# Altium footprint library SAMTEC THD.PcbLib: 161 footprints (part 4 of 12)
Each footprint in its own frame and in the unit in brackets; x right, y up, seen from the top. Pads: shape width x height; smd on the part's side, far side on the other; paste and mask are expansions set on the pad; w line width, h text height; cw(c..) or ccw(c..) is an arc to the next point about the centre after c.
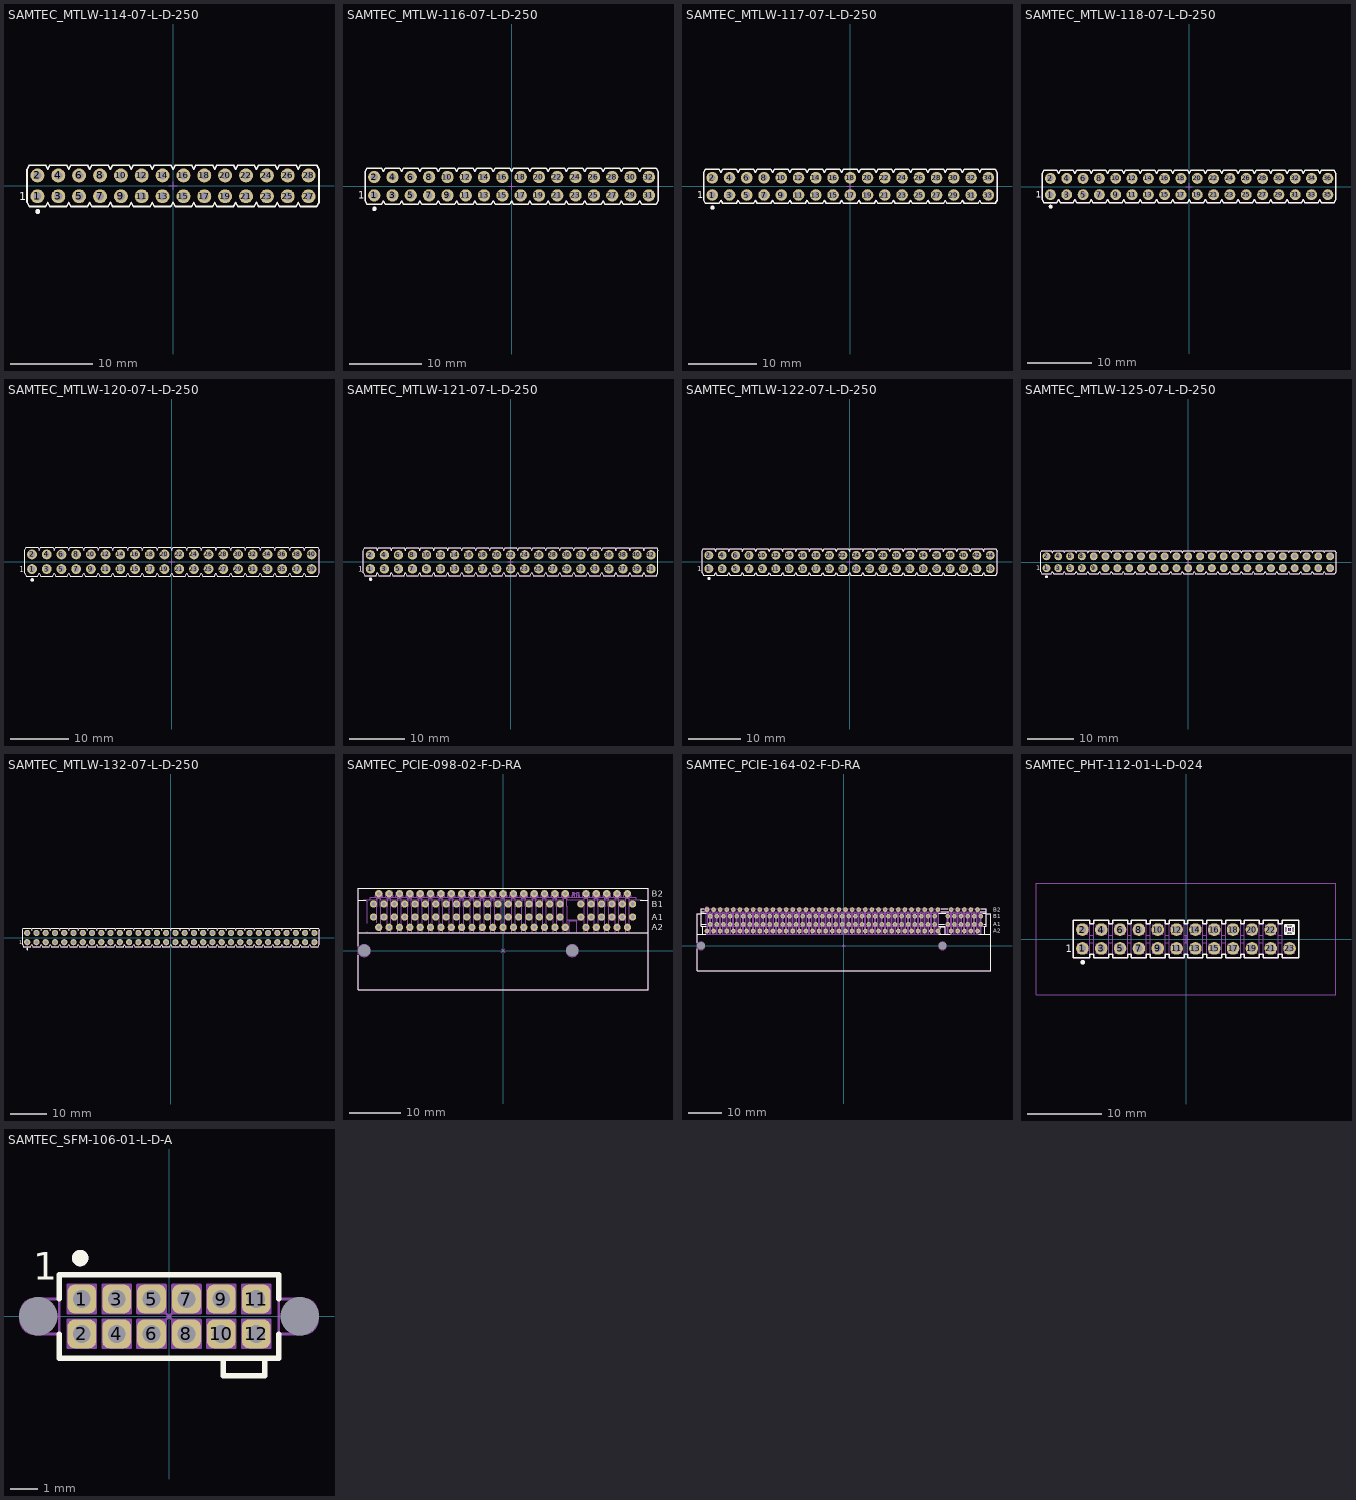
[diagram p3: the footprints below, top view; thin cyan lines are the x and y axes]

## SAMTEC_MTLW-114-07-L-D-250 [mm] "28 Contacts - Pitch 2.54mm - Dual Row Through Mount Straight Header (Post Lead = 6.35mm, Tail Lead 3.05mm, Insulator 1.52mm)"
height 7.87
pads (28):
  round 1.7 hole 1: 1(-16.51,-1.27) 2(-16.51,1.27) 3(-13.97,-1.27) 4(-13.97,1.27) 5(-11.43,-1.27) 6(-11.43,1.27) 7(-8.89,-1.27) 8(-8.89,1.27) 9(-6.35,-1.27) 10(-6.35,1.27) 11(-3.81,-1.27) 12(-3.81,1.27) 13(-1.27,-1.27) 14(-1.27,1.27) 15(1.27,-1.27) 16(1.27,1.27) 17(3.81,-1.27) 18(3.81,1.27) 19(6.35,-1.27) 20(6.35,1.27) 21(8.89,-1.27) 22(8.89,1.27) 23(11.43,-1.27) 24(11.43,1.27) 25(13.97,-1.27) 26(13.97,1.27) 27(16.51,-1.27) 28(16.51,1.27)
Top Overlay:
  circle w0.3: c-16.475,-3.135 r0.15
  lines w0.2: -17.78,-2.007 -17.526,-2.515 -15.494,-2.515 -15.24,-2.007 -14.986,-2.515 -12.954,-2.515 -12.7,-2.007 -12.446,-2.515 -10.414,-2.515 -10.16,-2.007 -9.906,-2.515 -7.874,-2.515 -7.62,-2.007 -7.366,-2.515 -5.334,-2.515 -5.08,-2.007 -4.826,-2.515 -2.794,-2.515 -2.54,-2.007 -2.286,-2.515 -0.254,-2.515 0,-2.007 0.254,-2.515 2.286,-2.515 2.54,-2.007 2.794,-2.515 4.826,-2.515 5.08,-2.007 5.334,-2.515 7.366,-2.515 7.62,-2.007 7.874,-2.515 9.906,-2.515 10.16,-2.007 10.414,-2.515 12.446,-2.515 12.7,-2.007 12.954,-2.515 14.986,-2.515 15.24,-2.007 15.494,-2.515 17.526,-2.515 17.78,-2.007 17.78,2.007 17.526,2.515 15.494,2.515 15.24,2.007 14.986,2.515 12.954,2.515 12.7,2.007 12.446,2.515 10.414,2.515 10.16,2.007 9.906,2.515 7.874,2.515 7.62,2.007 7.366,2.515 5.334,2.515 5.08,2.007 4.826,2.515 2.794,2.515 2.54,2.007 2.286,2.515 0.254,2.515 0,2.007 -0.254,2.515 -2.286,2.515 -2.54,2.007 -2.794,2.515 -4.826,2.515 -5.08,2.007 -5.334,2.515 -7.366,2.515 -7.62,2.007 -7.874,2.515 -9.906,2.515 -10.16,2.007 -10.414,2.515 -12.446,2.515 -12.7,2.007 -12.954,2.515 -14.986,2.515 -15.24,2.007 -15.494,2.515 -17.526,2.515 -17.78,2.007 -17.78,-2.007
  text "1" at -18.757,-1.768 h1
Mechanical 8:
  lines w0.1: -17.01,-1.27 -16.51,-1.27 ; -17.01,1.27 -16.51,1.27 ; -16.51,-1.77 -16.51,-1.27 ; -16.51,-0.77 -16.51,-1.27 ; -16.51,0.77 -16.51,1.27 ; -16.51,1.77 -16.51,1.27 ; -16.01,-1.27 -16.51,-1.27 ; -16.01,1.27 -16.51,1.27 ; -14.47,-1.27 -13.97,-1.27 ; -14.47,1.27 -13.97,1.27 ; -13.97,-1.77 -13.97,-1.27 ; -13.97,-0.77 -13.97,-1.27 ; -13.97,0.77 -13.97,1.27 ; -13.97,1.77 -13.97,1.27 ; -13.47,-1.27 -13.97,-1.27 ; -13.47,1.27 -13.97,1.27 ; -11.93,-1.27 -11.43,-1.27 ; -11.93,1.27 -11.43,1.27 ; -11.43,-1.77 -11.43,-1.27 ; -11.43,-0.77 -11.43,-1.27 ; -11.43,0.77 -11.43,1.27 ; -11.43,1.77 -11.43,1.27 ; -10.93,-1.27 -11.43,-1.27 ; -10.93,1.27 -11.43,1.27 ; -9.39,-1.27 -8.89,-1.27 ; -9.39,1.27 -8.89,1.27 ; -8.89,-1.77 -8.89,-1.27 ; -8.89,-0.77 -8.89,-1.27 ; -8.89,0.77 -8.89,1.27 ; -8.89,1.77 -8.89,1.27 ; -8.39,-1.27 -8.89,-1.27 ; -8.39,1.27 -8.89,1.27 ; -6.85,-1.27 -6.35,-1.27 ; -6.85,1.27 -6.35,1.27 ; -6.35,-1.77 -6.35,-1.27 ; -6.35,-0.77 -6.35,-1.27 ; -6.35,0.77 -6.35,1.27 ; -6.35,1.77 -6.35,1.27 ; -5.85,-1.27 -6.35,-1.27 ; -5.85,1.27 -6.35,1.27 ; -4.31,-1.27 -3.81,-1.27 ; -4.31,1.27 -3.81,1.27 ; -3.81,-1.77 -3.81,-1.27 ; -3.81,-0.77 -3.81,-1.27 ; -3.81,0.77 -3.81,1.27 ; -3.81,1.77 -3.81,1.27 ; -3.31,-1.27 -3.81,-1.27 ; -3.31,1.27 -3.81,1.27 ; -1.77,-1.27 -1.27,-1.27 ; -1.77,1.27 -1.27,1.27 ; -1.27,-1.77 -1.27,-1.27 ; -1.27,-0.77 -1.27,-1.27 ; -1.27,0.77 -1.27,1.27 ; -1.27,1.77 -1.27,1.27 ; -0.77,-1.27 -1.27,-1.27 ; -0.77,1.27 -1.27,1.27 ; -0.5,0 0,0 ; 0,-0.5 0,0 ; 0,0.5 0,0 ; 0.5,0 0,0 ; 0.77,-1.27 1.27,-1.27 ; 0.77,1.27 1.27,1.27 ; 1.27,-1.77 1.27,-1.27 ; 1.27,-0.77 1.27,-1.27 ; 1.27,0.77 1.27,1.27 ; 1.27,1.77 1.27,1.27 ; 1.77,-1.27 1.27,-1.27 ; 1.77,1.27 1.27,1.27 ; 3.31,-1.27 3.81,-1.27 ; 3.31,1.27 3.81,1.27 ; 3.81,-1.77 3.81,-1.27 ; 3.81,-0.77 3.81,-1.27 ; 3.81,0.77 3.81,1.27 ; 3.81,1.77 3.81,1.27 ; 4.31,-1.27 3.81,-1.27 ; 4.31,1.27 3.81,1.27 ; 5.85,-1.27 6.35,-1.27 ; 5.85,1.27 6.35,1.27 ; 6.35,-1.77 6.35,-1.27 ; 6.35,-0.77 6.35,-1.27 ; 6.35,0.77 6.35,1.27 ; 6.35,1.77 6.35,1.27 ; 6.85,-1.27 6.35,-1.27 ; 6.85,1.27 6.35,1.27 ; 8.39,-1.27 8.89,-1.27 ; 8.39,1.27 8.89,1.27 ; 8.89,-1.77 8.89,-1.27 ; 8.89,-0.77 8.89,-1.27 ; 8.89,0.77 8.89,1.27 ; 8.89,1.77 8.89,1.27 ; 9.39,-1.27 8.89,-1.27 ; 9.39,1.27 8.89,1.27 ; 10.93,-1.27 11.43,-1.27 ; 10.93,1.27 11.43,1.27 ; 11.43,-1.77 11.43,-1.27 ; 11.43,-0.77 11.43,-1.27 ; 11.43,0.77 11.43,1.27 ; 11.43,1.77 11.43,1.27 ; 11.93,-1.27 11.43,-1.27 ; 11.93,1.27 11.43,1.27 ; 13.47,-1.27 13.97,-1.27 ; 13.47,1.27 13.97,1.27 ; 13.97,-1.77 13.97,-1.27 ; 13.97,-0.77 13.97,-1.27 ; 13.97,0.77 13.97,1.27 ; 13.97,1.77 13.97,1.27 ; 14.47,-1.27 13.97,-1.27 ; 14.47,1.27 13.97,1.27 ; 16.01,-1.27 16.51,-1.27 ; 16.01,1.27 16.51,1.27 ; 16.51,-1.77 16.51,-1.27 ; 16.51,-0.77 16.51,-1.27 ; 16.51,0.77 16.51,1.27 ; 16.51,1.77 16.51,1.27 ; 17.01,-1.27 16.51,-1.27 ; 17.01,1.27 16.51,1.27
Mechanical 14:
  drawing of 199 lines, arcs and shapes, not listed
  text "1" at -18.757,-1.768 h1
3D body "SAMTEC_MTLW-114-07-L-D-250.stp": height 7.87, standoff -3.05, extent -17.78,-2.514 17.78,2.515

## SAMTEC_MTLW-116-07-L-D-250 [mm] "32 Contacts - Pitch 2.54mm - Dual Row Through Mount Straight Header (Post Lead = 6.35mm, Tail Lead 3.05mm, Insulator 1.52mm)"
height 7.87
pads (32):
  round 1.7 hole 1: 1(-19.05,-1.27) 2(-19.05,1.27) 3(-16.51,-1.27) 4(-16.51,1.27) 5(-13.97,-1.27) 6(-13.97,1.27) 7(-11.43,-1.27) 8(-11.43,1.27) 9(-8.89,-1.27) 10(-8.89,1.27) 11(-6.35,-1.27) 12(-6.35,1.27) 13(-3.81,-1.27) 14(-3.81,1.27) 15(-1.27,-1.27) 16(-1.27,1.27) 17(1.27,-1.27) 18(1.27,1.27) 19(3.81,-1.27) 20(3.81,1.27) 21(6.35,-1.27) 22(6.35,1.27) 23(8.89,-1.27) 24(8.89,1.27) 25(11.43,-1.27) 26(11.43,1.27) 27(13.97,-1.27) 28(13.97,1.27) 29(16.51,-1.27) 30(16.51,1.27) 31(19.05,-1.27) 32(19.05,1.27)
Top Overlay:
  circle w0.3: c-19.015,-3.135 r0.15
  lines w0.2: -20.32,-2.007 -20.32,2.007 -20.066,2.515 -18.034,2.515 -17.78,2.007 -17.526,2.515 -15.494,2.515 -15.24,2.007 -14.986,2.515 -12.954,2.515 -12.7,2.007 -12.446,2.515 -10.414,2.515 -10.16,2.007 -9.906,2.515 -7.874,2.515 -7.62,2.007 -7.366,2.515 -5.334,2.515 -5.08,2.007 -4.826,2.515 -2.794,2.515 -2.54,2.007 -2.286,2.515 -0.254,2.515 0,2.007 0.254,2.515 2.286,2.515 2.54,2.007 2.794,2.515 4.826,2.515 5.08,2.007 5.334,2.515 7.366,2.515 7.62,2.007 7.874,2.515 9.906,2.515 10.16,2.007 10.414,2.515 12.446,2.515 12.7,2.007 12.954,2.515 14.986,2.515 15.24,2.007 15.494,2.515 17.526,2.515 17.78,2.007 18.034,2.515 20.066,2.515 20.32,2.007 20.32,-2.007 20.066,-2.515 18.034,-2.515 17.78,-2.007 17.526,-2.515 15.494,-2.515 15.24,-2.007 14.986,-2.515 12.954,-2.515 12.7,-2.007 12.446,-2.515 10.414,-2.515 10.16,-2.007 9.906,-2.515 7.874,-2.515 7.62,-2.007 7.366,-2.515 5.334,-2.515 5.08,-2.007 4.826,-2.515 2.794,-2.515 2.54,-2.007 2.286,-2.515 0.254,-2.515 0,-2.007 -0.254,-2.515 -2.286,-2.515 -2.54,-2.007 -2.794,-2.515 -4.826,-2.515 -5.08,-2.007 -5.334,-2.515 -7.366,-2.515 -7.62,-2.007 -7.874,-2.515 -9.906,-2.515 -10.16,-2.007 -10.414,-2.515 -12.446,-2.515 -12.7,-2.007 -12.954,-2.515 -14.986,-2.515 -15.24,-2.007 -15.494,-2.515 -17.526,-2.515 -17.78,-2.007 -18.034,-2.515 -20.066,-2.515 -20.32,-2.007
  text "1" at -21.297,-1.768 h1
Mechanical 8:
  lines w0.1: -19.55,-1.27 -19.05,-1.27 ; -19.55,1.27 -19.05,1.27 ; -19.05,-1.77 -19.05,-1.27 ; -19.05,-0.77 -19.05,-1.27 ; -19.05,0.77 -19.05,1.27 ; -19.05,1.77 -19.05,1.27 ; -18.55,-1.27 -19.05,-1.27 ; -18.55,1.27 -19.05,1.27 ; -17.01,-1.27 -16.51,-1.27 ; -17.01,1.27 -16.51,1.27 ; -16.51,-1.77 -16.51,-1.27 ; -16.51,-0.77 -16.51,-1.27 ; -16.51,0.77 -16.51,1.27 ; -16.51,1.77 -16.51,1.27 ; -16.01,-1.27 -16.51,-1.27 ; -16.01,1.27 -16.51,1.27 ; -14.47,-1.27 -13.97,-1.27 ; -14.47,1.27 -13.97,1.27 ; -13.97,-1.77 -13.97,-1.27 ; -13.97,-0.77 -13.97,-1.27 ; -13.97,0.77 -13.97,1.27 ; -13.97,1.77 -13.97,1.27 ; -13.47,-1.27 -13.97,-1.27 ; -13.47,1.27 -13.97,1.27 ; -11.93,-1.27 -11.43,-1.27 ; -11.93,1.27 -11.43,1.27 ; -11.43,-1.77 -11.43,-1.27 ; -11.43,-0.77 -11.43,-1.27 ; -11.43,0.77 -11.43,1.27 ; -11.43,1.77 -11.43,1.27 ; -10.93,-1.27 -11.43,-1.27 ; -10.93,1.27 -11.43,1.27 ; -9.39,-1.27 -8.89,-1.27 ; -9.39,1.27 -8.89,1.27 ; -8.89,-1.77 -8.89,-1.27 ; -8.89,-0.77 -8.89,-1.27 ; -8.89,0.77 -8.89,1.27 ; -8.89,1.77 -8.89,1.27 ; -8.39,-1.27 -8.89,-1.27 ; -8.39,1.27 -8.89,1.27 ; -6.85,-1.27 -6.35,-1.27 ; -6.85,1.27 -6.35,1.27 ; -6.35,-1.77 -6.35,-1.27 ; -6.35,-0.77 -6.35,-1.27 ; -6.35,0.77 -6.35,1.27 ; -6.35,1.77 -6.35,1.27 ; -5.85,-1.27 -6.35,-1.27 ; -5.85,1.27 -6.35,1.27 ; -4.31,-1.27 -3.81,-1.27 ; -4.31,1.27 -3.81,1.27 ; -3.81,-1.77 -3.81,-1.27 ; -3.81,-0.77 -3.81,-1.27 ; -3.81,0.77 -3.81,1.27 ; -3.81,1.77 -3.81,1.27 ; -3.31,-1.27 -3.81,-1.27 ; -3.31,1.27 -3.81,1.27 ; -1.77,-1.27 -1.27,-1.27 ; -1.77,1.27 -1.27,1.27 ; -1.27,-1.77 -1.27,-1.27 ; -1.27,-0.77 -1.27,-1.27 ; -1.27,0.77 -1.27,1.27 ; -1.27,1.77 -1.27,1.27 ; -0.77,-1.27 -1.27,-1.27 ; -0.77,1.27 -1.27,1.27 ; -0.5,0 0,0 ; 0,-0.5 0,0 ; 0,0.5 0,0 ; 0.5,0 0,0 ; 0.77,-1.27 1.27,-1.27 ; 0.77,1.27 1.27,1.27 ; 1.27,-1.77 1.27,-1.27 ; 1.27,-0.77 1.27,-1.27 ; 1.27,0.77 1.27,1.27 ; 1.27,1.77 1.27,1.27 ; 1.77,-1.27 1.27,-1.27 ; 1.77,1.27 1.27,1.27 ; 3.31,-1.27 3.81,-1.27 ; 3.31,1.27 3.81,1.27 ; 3.81,-1.77 3.81,-1.27 ; 3.81,-0.77 3.81,-1.27 ; 3.81,0.77 3.81,1.27 ; 3.81,1.77 3.81,1.27 ; 4.31,-1.27 3.81,-1.27 ; 4.31,1.27 3.81,1.27 ; 5.85,-1.27 6.35,-1.27 ; 5.85,1.27 6.35,1.27 ; 6.35,-1.77 6.35,-1.27 ; 6.35,-0.77 6.35,-1.27 ; 6.35,0.77 6.35,1.27 ; 6.35,1.77 6.35,1.27 ; 6.85,-1.27 6.35,-1.27 ; 6.85,1.27 6.35,1.27 ; 8.39,-1.27 8.89,-1.27 ; 8.39,1.27 8.89,1.27 ; 8.89,-1.77 8.89,-1.27 ; 8.89,-0.77 8.89,-1.27 ; 8.89,0.77 8.89,1.27 ; 8.89,1.77 8.89,1.27 ; 9.39,-1.27 8.89,-1.27 ; 9.39,1.27 8.89,1.27 ; 10.93,-1.27 11.43,-1.27 ; 10.93,1.27 11.43,1.27 ; 11.43,-1.77 11.43,-1.27 ; 11.43,-0.77 11.43,-1.27 ; 11.43,0.77 11.43,1.27 ; 11.43,1.77 11.43,1.27 ; 11.93,-1.27 11.43,-1.27 ; 11.93,1.27 11.43,1.27 ; 13.47,-1.27 13.97,-1.27 ; 13.47,1.27 13.97,1.27 ; 13.97,-1.77 13.97,-1.27 ; 13.97,-0.77 13.97,-1.27 ; 13.97,0.77 13.97,1.27 ; 13.97,1.77 13.97,1.27 ; 14.47,-1.27 13.97,-1.27 ; 14.47,1.27 13.97,1.27 ; 16.01,-1.27 16.51,-1.27 ; 16.01,1.27 16.51,1.27 ; 16.51,-1.77 16.51,-1.27 ; 16.51,-0.77 16.51,-1.27 ; 16.51,0.77 16.51,1.27 ; 16.51,1.77 16.51,1.27 ; 17.01,-1.27 16.51,-1.27 ; 17.01,1.27 16.51,1.27 ; 18.55,-1.27 19.05,-1.27 ; 18.55,1.27 19.05,1.27 ; 19.05,-1.77 19.05,-1.27 ; 19.05,-0.77 19.05,-1.27 ; 19.05,0.77 19.05,1.27 ; 19.05,1.77 19.05,1.27 ; 19.55,-1.27 19.05,-1.27 ; 19.55,1.27 19.05,1.27
Mechanical 14:
  drawing of 227 lines, arcs and shapes, not listed
  text "1" at -21.297,-1.768 h1
3D body "SAMTEC_MTLW-116-07-L-D-250.stp": height 7.87, standoff -3.05, extent -20.32,-2.514 20.32,2.515

## SAMTEC_MTLW-117-07-L-D-250 [mm] "34 Contacts - Pitch 2.54mm - Dual Row Through Mount Straight Header (Post Lead = 6.35mm, Tail Lead 3.05mm, Insulator 1.52mm)"
height 7.87
pads (34):
  round 1.7 hole 1: 1(-20.32,-1.27) 2(-20.32,1.27) 3(-17.78,-1.27) 4(-17.78,1.27) 5(-15.24,-1.27) 6(-15.24,1.27) 7(-12.7,-1.27) 8(-12.7,1.27) 9(-10.16,-1.27) 10(-10.16,1.27) 11(-7.62,-1.27) 12(-7.62,1.27) 13(-5.08,-1.27) 14(-5.08,1.27) 15(-2.54,-1.27) 16(-2.54,1.27) 17(0,-1.27) 18(0,1.27) 19(2.54,-1.27) 20(2.54,1.27) 21(5.08,-1.27) 22(5.08,1.27) 23(7.62,-1.27) 24(7.62,1.27) 25(10.16,-1.27) 26(10.16,1.27) 27(12.7,-1.27) 28(12.7,1.27) 29(15.24,-1.27) 30(15.24,1.27) 31(17.78,-1.27) 32(17.78,1.27) 33(20.32,-1.27) 34(20.32,1.27)
Top Overlay:
  circle w0.3: c-20.285,-3.135 r0.15
  lines w0.2: -21.59,-2.007 -21.59,2.007 -21.336,2.515 -19.304,2.515 -19.05,2.007 -18.796,2.515 -16.764,2.515 -16.51,2.007 -16.256,2.515 -14.224,2.515 -13.97,2.007 -13.716,2.515 -11.684,2.515 -11.43,2.007 -11.176,2.515 -9.144,2.515 -8.89,2.007 -8.636,2.515 -6.604,2.515 -6.35,2.007 -6.096,2.515 -4.064,2.515 -3.81,2.007 -3.556,2.515 -1.524,2.515 -1.27,2.007 -1.016,2.515 1.016,2.515 1.27,2.007 1.524,2.515 3.556,2.515 3.81,2.007 4.064,2.515 6.096,2.515 6.35,2.007 6.604,2.515 8.636,2.515 8.89,2.007 9.144,2.515 11.176,2.515 11.43,2.007 11.684,2.515 13.716,2.515 13.97,2.007 14.224,2.515 16.256,2.515 16.51,2.007 16.764,2.515 18.796,2.515 19.05,2.007 19.304,2.515 21.336,2.515 21.59,2.007 21.59,-2.007 21.336,-2.515 19.304,-2.515 19.05,-2.007 18.796,-2.515 16.764,-2.515 16.51,-2.007 16.256,-2.515 14.224,-2.515 13.97,-2.007 13.716,-2.515 11.684,-2.515 11.43,-2.007 11.176,-2.515 9.144,-2.515 8.89,-2.007 8.636,-2.515 6.604,-2.515 6.35,-2.007 6.096,-2.515 4.064,-2.515 3.81,-2.007 3.556,-2.515 1.524,-2.515 1.27,-2.007 1.016,-2.515 -1.016,-2.515 -1.27,-2.007 -1.524,-2.515 -3.556,-2.515 -3.81,-2.007 -4.064,-2.515 -6.096,-2.515 -6.35,-2.007 -6.604,-2.515 -8.636,-2.515 -8.89,-2.007 -9.144,-2.515 -11.176,-2.515 -11.43,-2.007 -11.684,-2.515 -13.716,-2.515 -13.97,-2.007 -14.224,-2.515 -16.256,-2.515 -16.51,-2.007 -16.764,-2.515 -18.796,-2.515 -19.05,-2.007 -19.304,-2.515 -21.336,-2.515 -21.59,-2.007
  text "1" at -22.567,-1.768 h1
Mechanical 8:
  lines w0.1: -20.82,-1.27 -20.32,-1.27 ; -20.82,1.27 -20.32,1.27 ; -20.32,-1.77 -20.32,-1.27 ; -20.32,-0.77 -20.32,-1.27 ; -20.32,0.77 -20.32,1.27 ; -20.32,1.77 -20.32,1.27 ; -19.82,-1.27 -20.32,-1.27 ; -19.82,1.27 -20.32,1.27 ; -18.28,-1.27 -17.78,-1.27 ; -18.28,1.27 -17.78,1.27 ; -17.78,-1.77 -17.78,-1.27 ; -17.78,-0.77 -17.78,-1.27 ; -17.78,0.77 -17.78,1.27 ; -17.78,1.77 -17.78,1.27 ; -17.28,-1.27 -17.78,-1.27 ; -17.28,1.27 -17.78,1.27 ; -15.74,-1.27 -15.24,-1.27 ; -15.74,1.27 -15.24,1.27 ; -15.24,-1.77 -15.24,-1.27 ; -15.24,-0.77 -15.24,-1.27 ; -15.24,0.77 -15.24,1.27 ; -15.24,1.77 -15.24,1.27 ; -14.74,-1.27 -15.24,-1.27 ; -14.74,1.27 -15.24,1.27 ; -13.2,-1.27 -12.7,-1.27 ; -13.2,1.27 -12.7,1.27 ; -12.7,-1.77 -12.7,-1.27 ; -12.7,-0.77 -12.7,-1.27 ; -12.7,0.77 -12.7,1.27 ; -12.7,1.77 -12.7,1.27 ; -12.2,-1.27 -12.7,-1.27 ; -12.2,1.27 -12.7,1.27 ; -10.66,-1.27 -10.16,-1.27 ; -10.66,1.27 -10.16,1.27 ; -10.16,-1.77 -10.16,-1.27 ; -10.16,-0.77 -10.16,-1.27 ; -10.16,0.77 -10.16,1.27 ; -10.16,1.77 -10.16,1.27 ; -9.66,-1.27 -10.16,-1.27 ; -9.66,1.27 -10.16,1.27 ; -8.12,-1.27 -7.62,-1.27 ; -8.12,1.27 -7.62,1.27 ; -7.62,-1.77 -7.62,-1.27 ; -7.62,-0.77 -7.62,-1.27 ; -7.62,0.77 -7.62,1.27 ; -7.62,1.77 -7.62,1.27 ; -7.12,-1.27 -7.62,-1.27 ; -7.12,1.27 -7.62,1.27 ; -5.58,-1.27 -5.08,-1.27 ; -5.58,1.27 -5.08,1.27 ; -5.08,-1.77 -5.08,-1.27 ; -5.08,-0.77 -5.08,-1.27 ; -5.08,0.77 -5.08,1.27 ; -5.08,1.77 -5.08,1.27 ; -4.58,-1.27 -5.08,-1.27 ; -4.58,1.27 -5.08,1.27 ; -3.04,-1.27 -2.54,-1.27 ; -3.04,1.27 -2.54,1.27 ; -2.54,-1.77 -2.54,-1.27 ; -2.54,-0.77 -2.54,-1.27 ; -2.54,0.77 -2.54,1.27 ; -2.54,1.77 -2.54,1.27 ; -2.04,-1.27 -2.54,-1.27 ; -2.04,1.27 -2.54,1.27 ; -0.5,-1.27 0,-1.27 ; -0.5,0 0,0 ; -0.5,1.27 0,1.27 ; 0,-1.77 0,-1.27 ; 0,-0.77 0,-1.27 ; 0,-0.5 0,0 ; 0,0.5 0,0 ; 0,0.77 0,1.27 ; 0,1.77 0,1.27 ; 0.5,-1.27 0,-1.27 ; 0.5,0 0,0 ; 0.5,1.27 0,1.27 ; 2.04,-1.27 2.54,-1.27 ; 2.04,1.27 2.54,1.27 ; 2.54,-1.77 2.54,-1.27 ; 2.54,-0.77 2.54,-1.27 ; 2.54,0.77 2.54,1.27 ; 2.54,1.77 2.54,1.27 ; 3.04,-1.27 2.54,-1.27 ; 3.04,1.27 2.54,1.27 ; 4.58,-1.27 5.08,-1.27 ; 4.58,1.27 5.08,1.27 ; 5.08,-1.77 5.08,-1.27 ; 5.08,-0.77 5.08,-1.27 ; 5.08,0.77 5.08,1.27 ; 5.08,1.77 5.08,1.27 ; 5.58,-1.27 5.08,-1.27 ; 5.58,1.27 5.08,1.27 ; 7.12,-1.27 7.62,-1.27 ; 7.12,1.27 7.62,1.27 ; 7.62,-1.77 7.62,-1.27 ; 7.62,-0.77 7.62,-1.27 ; 7.62,0.77 7.62,1.27 ; 7.62,1.77 7.62,1.27 ; 8.12,-1.27 7.62,-1.27 ; 8.12,1.27 7.62,1.27 ; 9.66,-1.27 10.16,-1.27 ; 9.66,1.27 10.16,1.27 ; 10.16,-1.77 10.16,-1.27 ; 10.16,-0.77 10.16,-1.27 ; 10.16,0.77 10.16,1.27 ; 10.16,1.77 10.16,1.27 ; 10.66,-1.27 10.16,-1.27 ; 10.66,1.27 10.16,1.27 ; 12.2,-1.27 12.7,-1.27 ; 12.2,1.27 12.7,1.27 ; 12.7,-1.77 12.7,-1.27 ; 12.7,-0.77 12.7,-1.27 ; 12.7,0.77 12.7,1.27 ; 12.7,1.77 12.7,1.27 ; 13.2,-1.27 12.7,-1.27 ; 13.2,1.27 12.7,1.27 ; 14.74,-1.27 15.24,-1.27 ; 14.74,1.27 15.24,1.27 ; 15.24,-1.77 15.24,-1.27 ; 15.24,-0.77 15.24,-1.27 ; 15.24,0.77 15.24,1.27 ; 15.24,1.77 15.24,1.27 ; 15.74,-1.27 15.24,-1.27 ; 15.74,1.27 15.24,1.27 ; 17.28,-1.27 17.78,-1.27 ; 17.28,1.27 17.78,1.27 ; 17.78,-1.77 17.78,-1.27 ; 17.78,-0.77 17.78,-1.27 ; 17.78,0.77 17.78,1.27 ; 17.78,1.77 17.78,1.27 ; 18.28,-1.27 17.78,-1.27 ; 18.28,1.27 17.78,1.27 ; 19.82,-1.27 20.32,-1.27 ; 19.82,1.27 20.32,1.27 ; 20.32,-1.77 20.32,-1.27 ; 20.32,-0.77 20.32,-1.27 ; 20.32,0.77 20.32,1.27 ; 20.32,1.77 20.32,1.27 ; 20.82,-1.27 20.32,-1.27 ; 20.82,1.27 20.32,1.27
Mechanical 14:
  drawing of 241 lines, arcs and shapes, not listed
  text "1" at -22.567,-1.768 h1
3D body "SAMTEC_MTLW-117-07-L-D-250.stp": height 7.87, standoff -3.05, extent -21.59,-2.514 21.59,2.515

## SAMTEC_MTLW-118-07-L-D-250 [mm] "36 Contacts - Pitch 2.54mm - Dual Row Through Mount Straight Header (Post Lead = 6.35mm, Tail Lead 3.05mm, Insulator 1.52mm)"
height 7.87
pads (36):
  round 1.7 hole 1: 1(-21.59,-1.27) 2(-21.59,1.27) 3(-19.05,-1.27) 4(-19.05,1.27) 5(-16.51,-1.27) 6(-16.51,1.27) 7(-13.97,-1.27) 8(-13.97,1.27) 9(-11.43,-1.27) 10(-11.43,1.27) 11(-8.89,-1.27) 12(-8.89,1.27) 13(-6.35,-1.27) 14(-6.35,1.27) 15(-3.81,-1.27) 16(-3.81,1.27) 17(-1.27,-1.27) 18(-1.27,1.27) 19(1.27,-1.27) 20(1.27,1.27) 21(3.81,-1.27) 22(3.81,1.27) 23(6.35,-1.27) 24(6.35,1.27) 25(8.89,-1.27) 26(8.89,1.27) 27(11.43,-1.27) 28(11.43,1.27) 29(13.97,-1.27) 30(13.97,1.27) 31(16.51,-1.27) 32(16.51,1.27) 33(19.05,-1.27) 34(19.05,1.27) 35(21.59,-1.27) 36(21.59,1.27)
Top Overlay:
  circle w0.3: c-21.555,-3.135 r0.15
  lines w0.2: -22.86,-2.007 -22.606,-2.515 -20.574,-2.515 -20.32,-2.007 -20.066,-2.515 -18.034,-2.515 -17.78,-2.007 -17.526,-2.515 -15.494,-2.515 -15.24,-2.007 -14.986,-2.515 -12.954,-2.515 -12.7,-2.007 -12.446,-2.515 -10.414,-2.515 -10.16,-2.007 -9.906,-2.515 -7.874,-2.515 -7.62,-2.007 -7.366,-2.515 -5.334,-2.515 -5.08,-2.007 -4.826,-2.515 -2.794,-2.515 -2.54,-2.007 -2.286,-2.515 -0.254,-2.515 0,-2.007 0.254,-2.515 2.286,-2.515 2.54,-2.007 2.794,-2.515 4.826,-2.515 5.08,-2.007 5.334,-2.515 7.366,-2.515 7.62,-2.007 7.874,-2.515 9.906,-2.515 10.16,-2.007 10.414,-2.515 12.446,-2.515 12.7,-2.007 12.954,-2.515 14.986,-2.515 15.24,-2.007 15.494,-2.515 17.526,-2.515 17.78,-2.007 18.034,-2.515 20.066,-2.515 20.32,-2.007 20.574,-2.515 22.606,-2.515 22.86,-2.007 22.86,2.007 22.606,2.515 20.574,2.515 20.32,2.007 20.066,2.515 18.034,2.515 17.78,2.007 17.526,2.515 15.494,2.515 15.24,2.007 14.986,2.515 12.954,2.515 12.7,2.007 12.446,2.515 10.414,2.515 10.16,2.007 9.906,2.515 7.874,2.515 7.62,2.007 7.366,2.515 5.334,2.515 5.08,2.007 4.826,2.515 2.794,2.515 2.54,2.007 2.286,2.515 0.254,2.515 0,2.007 -0.254,2.515 -2.286,2.515 -2.54,2.007 -2.794,2.515 -4.826,2.515 -5.08,2.007 -5.334,2.515 -7.366,2.515 -7.62,2.007 -7.874,2.515 -9.906,2.515 -10.16,2.007 -10.414,2.515 -12.446,2.515 -12.7,2.007 -12.954,2.515 -14.986,2.515 -15.24,2.007 -15.494,2.515 -17.526,2.515 -17.78,2.007 -18.034,2.515 -20.066,2.515 -20.32,2.007 -20.574,2.515 -22.606,2.515 -22.86,2.007 -22.86,-2.007
  text "1" at -23.837,-1.768 h1
Mechanical 8:
  lines w0.1: -22.09,-1.27 -21.59,-1.27 ; -22.09,1.27 -21.59,1.27 ; -21.59,-1.77 -21.59,-1.27 ; -21.59,-0.77 -21.59,-1.27 ; -21.59,0.77 -21.59,1.27 ; -21.59,1.77 -21.59,1.27 ; -21.09,-1.27 -21.59,-1.27 ; -21.09,1.27 -21.59,1.27 ; -19.55,-1.27 -19.05,-1.27 ; -19.55,1.27 -19.05,1.27 ; -19.05,-1.77 -19.05,-1.27 ; -19.05,-0.77 -19.05,-1.27 ; -19.05,0.77 -19.05,1.27 ; -19.05,1.77 -19.05,1.27 ; -18.55,-1.27 -19.05,-1.27 ; -18.55,1.27 -19.05,1.27 ; -17.01,-1.27 -16.51,-1.27 ; -17.01,1.27 -16.51,1.27 ; -16.51,-1.77 -16.51,-1.27 ; -16.51,-0.77 -16.51,-1.27 ; -16.51,0.77 -16.51,1.27 ; -16.51,1.77 -16.51,1.27 ; -16.01,-1.27 -16.51,-1.27 ; -16.01,1.27 -16.51,1.27 ; -14.47,-1.27 -13.97,-1.27 ; -14.47,1.27 -13.97,1.27 ; -13.97,-1.77 -13.97,-1.27 ; -13.97,-0.77 -13.97,-1.27 ; -13.97,0.77 -13.97,1.27 ; -13.97,1.77 -13.97,1.27 ; -13.47,-1.27 -13.97,-1.27 ; -13.47,1.27 -13.97,1.27 ; -11.93,-1.27 -11.43,-1.27 ; -11.93,1.27 -11.43,1.27 ; -11.43,-1.77 -11.43,-1.27 ; -11.43,-0.77 -11.43,-1.27 ; -11.43,0.77 -11.43,1.27 ; -11.43,1.77 -11.43,1.27 ; -10.93,-1.27 -11.43,-1.27 ; -10.93,1.27 -11.43,1.27 ; -9.39,-1.27 -8.89,-1.27 ; -9.39,1.27 -8.89,1.27 ; -8.89,-1.77 -8.89,-1.27 ; -8.89,-0.77 -8.89,-1.27 ; -8.89,0.77 -8.89,1.27 ; -8.89,1.77 -8.89,1.27 ; -8.39,-1.27 -8.89,-1.27 ; -8.39,1.27 -8.89,1.27 ; -6.85,-1.27 -6.35,-1.27 ; -6.85,1.27 -6.35,1.27 ; -6.35,-1.77 -6.35,-1.27 ; -6.35,-0.77 -6.35,-1.27 ; -6.35,0.77 -6.35,1.27 ; -6.35,1.77 -6.35,1.27 ; -5.85,-1.27 -6.35,-1.27 ; -5.85,1.27 -6.35,1.27 ; -4.31,-1.27 -3.81,-1.27 ; -4.31,1.27 -3.81,1.27 ; -3.81,-1.77 -3.81,-1.27 ; -3.81,-0.77 -3.81,-1.27 ; -3.81,0.77 -3.81,1.27 ; -3.81,1.77 -3.81,1.27 ; -3.31,-1.27 -3.81,-1.27 ; -3.31,1.27 -3.81,1.27 ; -1.77,-1.27 -1.27,-1.27 ; -1.77,1.27 -1.27,1.27 ; -1.27,-1.77 -1.27,-1.27 ; -1.27,-0.77 -1.27,-1.27 ; -1.27,0.77 -1.27,1.27 ; -1.27,1.77 -1.27,1.27 ; -0.77,-1.27 -1.27,-1.27 ; -0.77,1.27 -1.27,1.27 ; -0.5,0 0,0 ; 0,-0.5 0,0 ; 0,0.5 0,0 ; 0.5,0 0,0 ; 0.77,-1.27 1.27,-1.27 ; 0.77,1.27 1.27,1.27 ; 1.27,-1.77 1.27,-1.27 ; 1.27,-0.77 1.27,-1.27 ; 1.27,0.77 1.27,1.27 ; 1.27,1.77 1.27,1.27 ; 1.77,-1.27 1.27,-1.27 ; 1.77,1.27 1.27,1.27 ; 3.31,-1.27 3.81,-1.27 ; 3.31,1.27 3.81,1.27 ; 3.81,-1.77 3.81,-1.27 ; 3.81,-0.77 3.81,-1.27 ; 3.81,0.77 3.81,1.27 ; 3.81,1.77 3.81,1.27 ; 4.31,-1.27 3.81,-1.27 ; 4.31,1.27 3.81,1.27 ; 5.85,-1.27 6.35,-1.27 ; 5.85,1.27 6.35,1.27 ; 6.35,-1.77 6.35,-1.27 ; 6.35,-0.77 6.35,-1.27 ; 6.35,0.77 6.35,1.27 ; 6.35,1.77 6.35,1.27 ; 6.85,-1.27 6.35,-1.27 ; 6.85,1.27 6.35,1.27 ; 8.39,-1.27 8.89,-1.27 ; 8.39,1.27 8.89,1.27 ; 8.89,-1.77 8.89,-1.27 ; 8.89,-0.77 8.89,-1.27 ; 8.89,0.77 8.89,1.27 ; 8.89,1.77 8.89,1.27 ; 9.39,-1.27 8.89,-1.27 ; 9.39,1.27 8.89,1.27 ; 10.93,-1.27 11.43,-1.27 ; 10.93,1.27 11.43,1.27 ; 11.43,-1.77 11.43,-1.27 ; 11.43,-0.77 11.43,-1.27 ; 11.43,0.77 11.43,1.27 ; 11.43,1.77 11.43,1.27 ; 11.93,-1.27 11.43,-1.27 ; 11.93,1.27 11.43,1.27 ; 13.47,-1.27 13.97,-1.27 ; 13.47,1.27 13.97,1.27 ; 13.97,-1.77 13.97,-1.27 ; 13.97,-0.77 13.97,-1.27 ; 13.97,0.77 13.97,1.27 ; 13.97,1.77 13.97,1.27 ; 14.47,-1.27 13.97,-1.27 ; 14.47,1.27 13.97,1.27 ; 16.01,-1.27 16.51,-1.27 ; 16.01,1.27 16.51,1.27 ; 16.51,-1.77 16.51,-1.27 ; 16.51,-0.77 16.51,-1.27 ; 16.51,0.77 16.51,1.27 ; 16.51,1.77 16.51,1.27 ; 17.01,-1.27 16.51,-1.27 ; 17.01,1.27 16.51,1.27 ; 18.55,-1.27 19.05,-1.27 ; 18.55,1.27 19.05,1.27 ; 19.05,-1.77 19.05,-1.27 ; 19.05,-0.77 19.05,-1.27 ; 19.05,0.77 19.05,1.27 ; 19.05,1.77 19.05,1.27 ; 19.55,-1.27 19.05,-1.27 ; 19.55,1.27 19.05,1.27 ; 21.09,-1.27 21.59,-1.27 ; 21.09,1.27 21.59,1.27 ; 21.59,-1.77 21.59,-1.27 ; 21.59,-0.77 21.59,-1.27 ; 21.59,0.77 21.59,1.27 ; 21.59,1.77 21.59,1.27 ; 22.09,-1.27 21.59,-1.27 ; 22.09,1.27 21.59,1.27